# Altium footprint library cool_library.PcbLib: 1182 footprints (part 3 of 75)
Each footprint in its own frame and in the unit in brackets; x right, y up, seen from the top. Pads: shape width x height; smd on the part's side, far side on the other; paste and mask are expansions set on the pad; w line width, h text height; cw(c..) or ccw(c..) is an arc to the next point about the centre after c.
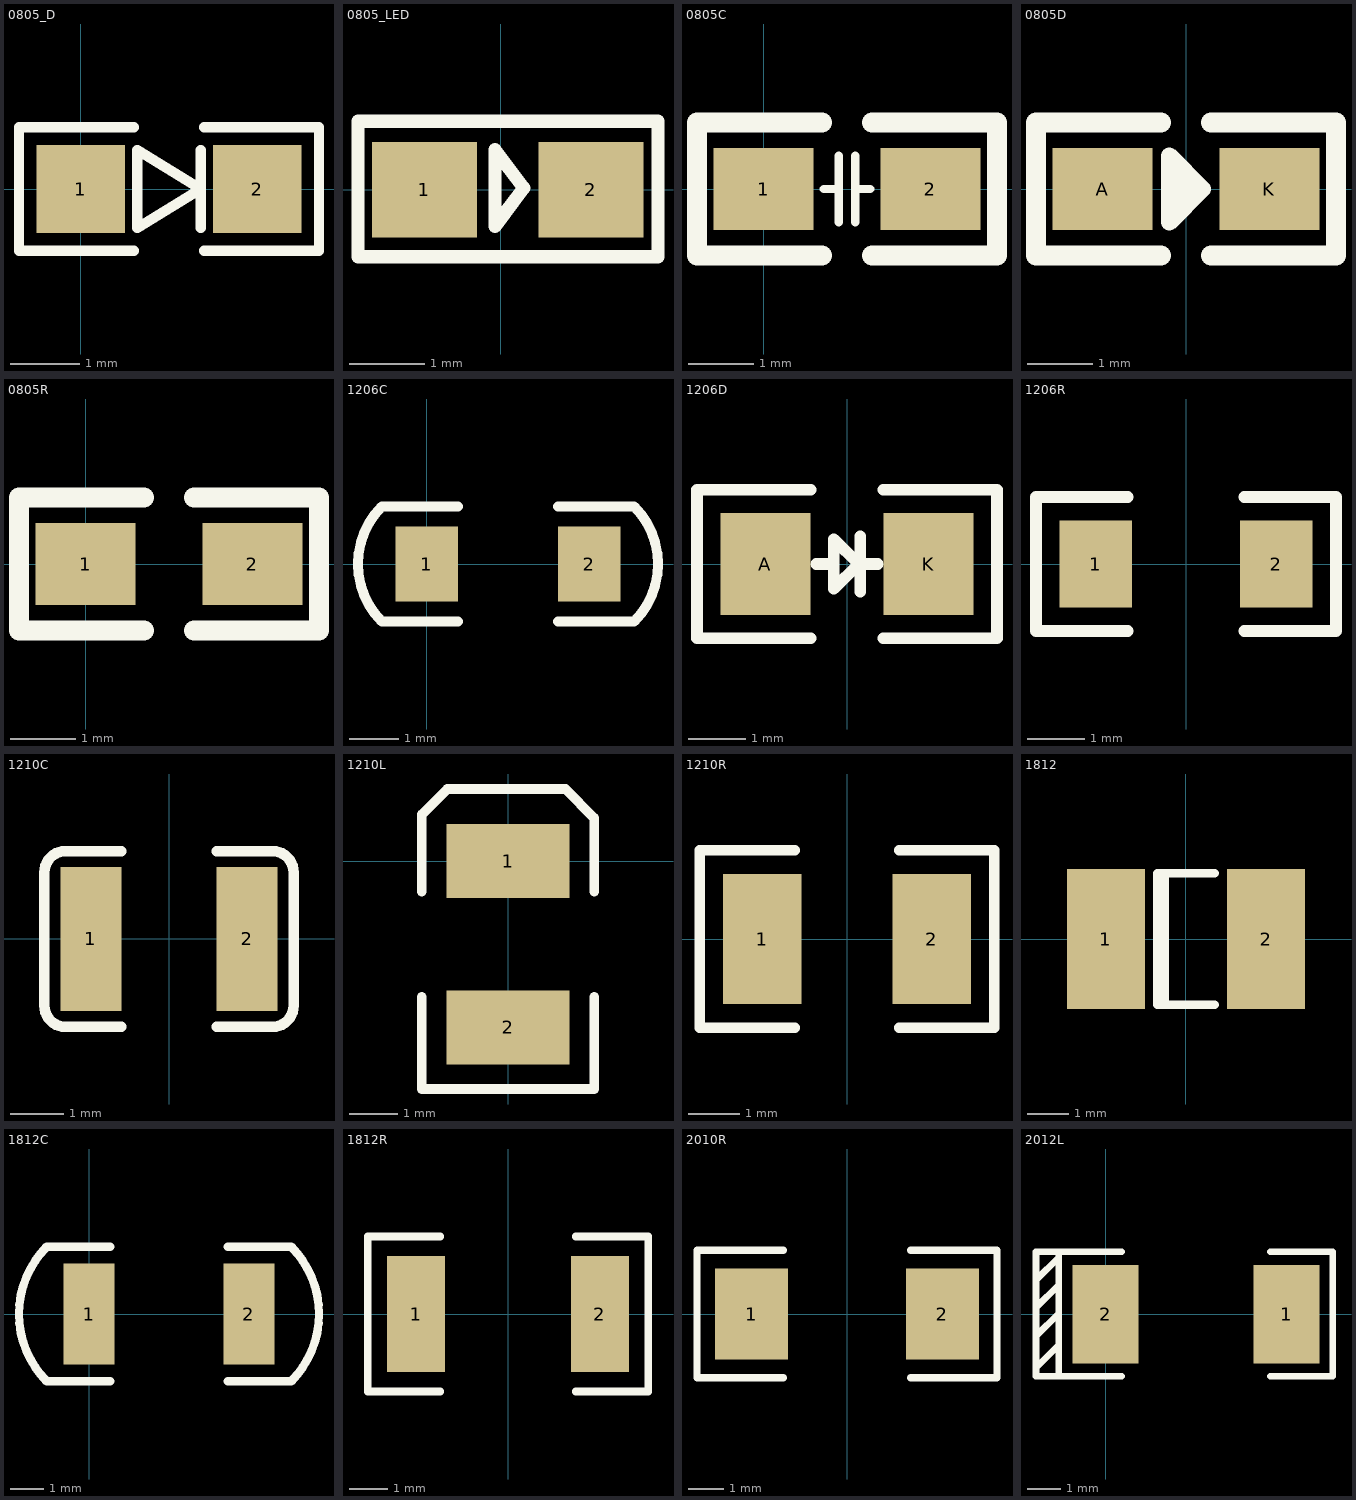
[diagram p2: the footprints below, top view; thin cyan lines are the x and y axes]

## 0805_D [mm]
pads (2):
  rect 1.27x1.27 smd: 1(0,0) 2(2.54,0)
Top Overlay:
  lines w0.15: 0.762,-0.889 -0.889,-0.889 -0.889,0.889 0.762,0.889 ; 1.727,-0.559 1.727,0 ; 1.727,0.559 1.727,0 ; 1.778,-0.889 3.429,-0.889 3.429,0.889 1.778,0.889 ; 1.727,0 0.813,-0.559 0.813,0 0.813,0.559 1.727,0

## 0805_LED [mm]
height 2
pads (2):
  rect 1.4x1.27 smd: 1(-1.016,0) 2(1.199,0)
Top Overlay:
  lines w0.178: -1.9,-0.889 -1.9,0.91 2.09,0.91 2.09,-0.889 -1.9,-0.889 ; -0.077,-0.485 -0.077,0.531 0.304,0.023 -0.077,-0.485

## 0805C [mm]
height 0.254
pads (2):
  rect 1.524x1.25 smd: 1(0,0) 2(2.54,0)
Top Overlay:
  lines w0.127: 0.914,0 1.143,0 ; 1.143,-0.508 1.143,0.508 ; 1.397,-0.508 1.397,0.508 ; 1.397,0 1.626,0
  lines w0.305: 0.889,-1.016 -1.016,-1.016 -1.016,1.016 0.889,1.016 ; 1.651,-1.016 3.556,-1.016 3.556,1.016 1.651,1.016

## 0805D [mm]
height 0.254
pads (2):
  rect 1.524x1.25 smd: A(-1.27,0) K(1.27,0)
Top Overlay:
  lines w0.254: -0.254,-0.254 -0.127,-0.254 0,-0.127 0,0 -0.1,0.1 -0.254,0.254 -0.254,0.508 ; -0.254,0.508 -0.254,-0.508 0.254,0 -0.254,0.508
  lines w0.305: -0.381,-1.016 -2.286,-1.016 -2.286,1.016 -0.381,1.016 ; 0.381,-1.016 2.286,-1.016 2.286,1.016 0.381,1.016

## 0805R [mm]
height 0.254
pads (2):
  rect 1.524x1.25 smd: 1(0,0) 2(2.54,0)
Top Overlay:
  lines w0.305: 0.889,-1.016 -1.016,-1.016 -1.016,1.016 0.889,1.016 ; 1.651,-1.016 3.556,-1.016 3.556,1.016 1.651,1.016

## 1206C [mil]
pads (2):
  rect 50x60 smd: 1(0,0) 2(130,0)
Top Overlay:
  lines w8: 25,-46 -36,-46 cw(c10,0) -36,46 25,46 ; 105,-46 166,-46 ccw(c120,0) 166,46 105,46

## 1206D [mil]
pads (2):
  rect 62x70 smd: A(-56,0) K(56,0)
Top Overlay:
  lines w8: -25,-51 -103,-51 -103,51 -25,51 ; -21,0 -9,0 ; 9,-19 9,19 ; 9,0 21,0 ; 25,-51 103,-51 103,51 25,51 ; -9,-17 8,0 -9,17 -9,-17

## 1206R [mil]
pads (2):
  rect 50x60 smd: 1(-62,0) 2(62,0)
Top Overlay:
  lines w8: -40,-46 -103,-46 -103,46 -40,46 ; 40,-46 103,-46 103,46 40,46

## 1210C [mm]
height 8.23
pads (2):
  rect 1.16x2.72 smd: 1(-1.475,0) 2(1.475,0)
Top Overlay:
  lines w0.2: -0.9,-1.66 -1.955,-1.66 cw(c-1.955,-1.26) -2.355,-1.26 -2.355,1.26 cw(c-1.955,1.26) -1.955,1.66 -0.9,1.66 ; 0.9,-1.66 1.955,-1.66 ccw(c1.955,-1.26) 2.355,-1.26 2.355,1.26 ccw(c1.955,1.26) 1.955,1.66 0.9,1.66

## 1210L [mil]
height 82.68
pads (2):
  rect 100x60 smd: 1(0,0) 2(0,-135)
Top Overlay:
  lines w7.87: -70,-110 -70,-185 70,-185 70,-110 ; -70,-25 -70,37.77 -49.25,58.51 46.66,58.51 70,35.17 70,-25

## 1210R [mil]
pads (2):
  rect 60x100 smd: 1(-65,0) 2(65,0)
Top Overlay:
  lines w8: -40,-68 -113,-68 -113,68 -40,68 ; 40,-68 113,-68 113,68 40,68

## 1812 [mm] "Chip Capacitor; Body 4.5 x 3.2 mm (LxW typ)"
height 1.1
pads (2):
  rect 1.9x3.4 smd: 1(-1.95,0) 2(1.95,0)
Top Overlay:
  lines w0.2: -0.51,-1.6 -0.51,1.6 ; 0.7,-1.6 -0.7,-1.6 -0.7,1.6 0.7,1.6

## 1812C [mil]
pads (2):
  rect 60x120 smd: 1(0,0) 2(190,0)
Top Overlay:
  lines w10: 25,-80 -50,-80 cw(c30,0) -50,80 25,80 ; 165,-80 240,-80 ccw(c160,0) 240,80 165,80

## 1812R [mil]
pads (2):
  rect 60x120 smd: 1(-95,0) 2(95,0)
Top Overlay:
  lines w8: -70,-80 -145,-80 -145,80 -70,80 ; 70,-80 145,-80 145,80 70,80

## 2010R [mil]
pads (2):
  rect 80x100 smd: 1(-105,0) 2(105,0)
Top Overlay:
  lines w8: -70,-70 -165,-70 -165,70 -70,70 ; 70,-70 165,-70 165,70 70,70

## 2012L [mm]
height 2.1
pads (2):
  rect 2x3 smd: 1(5.5,0) 2(0,0)
Top Overlay:
  lines w0.2: -2.116,-1.626 -1.456,-0.965 ; -2.116,-0.66 -1.421,0.035 ; -2.116,0.203 -1.421,0.898 ; -2.116,1.041 -1.421,1.737 ; -1.428,-1.88 -2.116,-1.88 -2.116,1.905 -1.421,1.905 ; 0.484,-1.886 -1.421,-1.886 -1.421,1.905 ; 0.484,1.905 -1.421,1.905 ; 4.996,-1.886 6.901,-1.886 6.901,1.905 4.996,1.905